# Altium footprint library Toi Library.PcbLib: 740 footprints (part 18 of 47)
Each footprint in its own frame and in the unit in brackets; x right, y up, seen from the top. Pads: shape width x height; smd on the part's side, far side on the other; paste and mask are expansions set on the pad; w line width, h text height; cw(c..) or ccw(c..) is an arc to the next point about the centre after c.
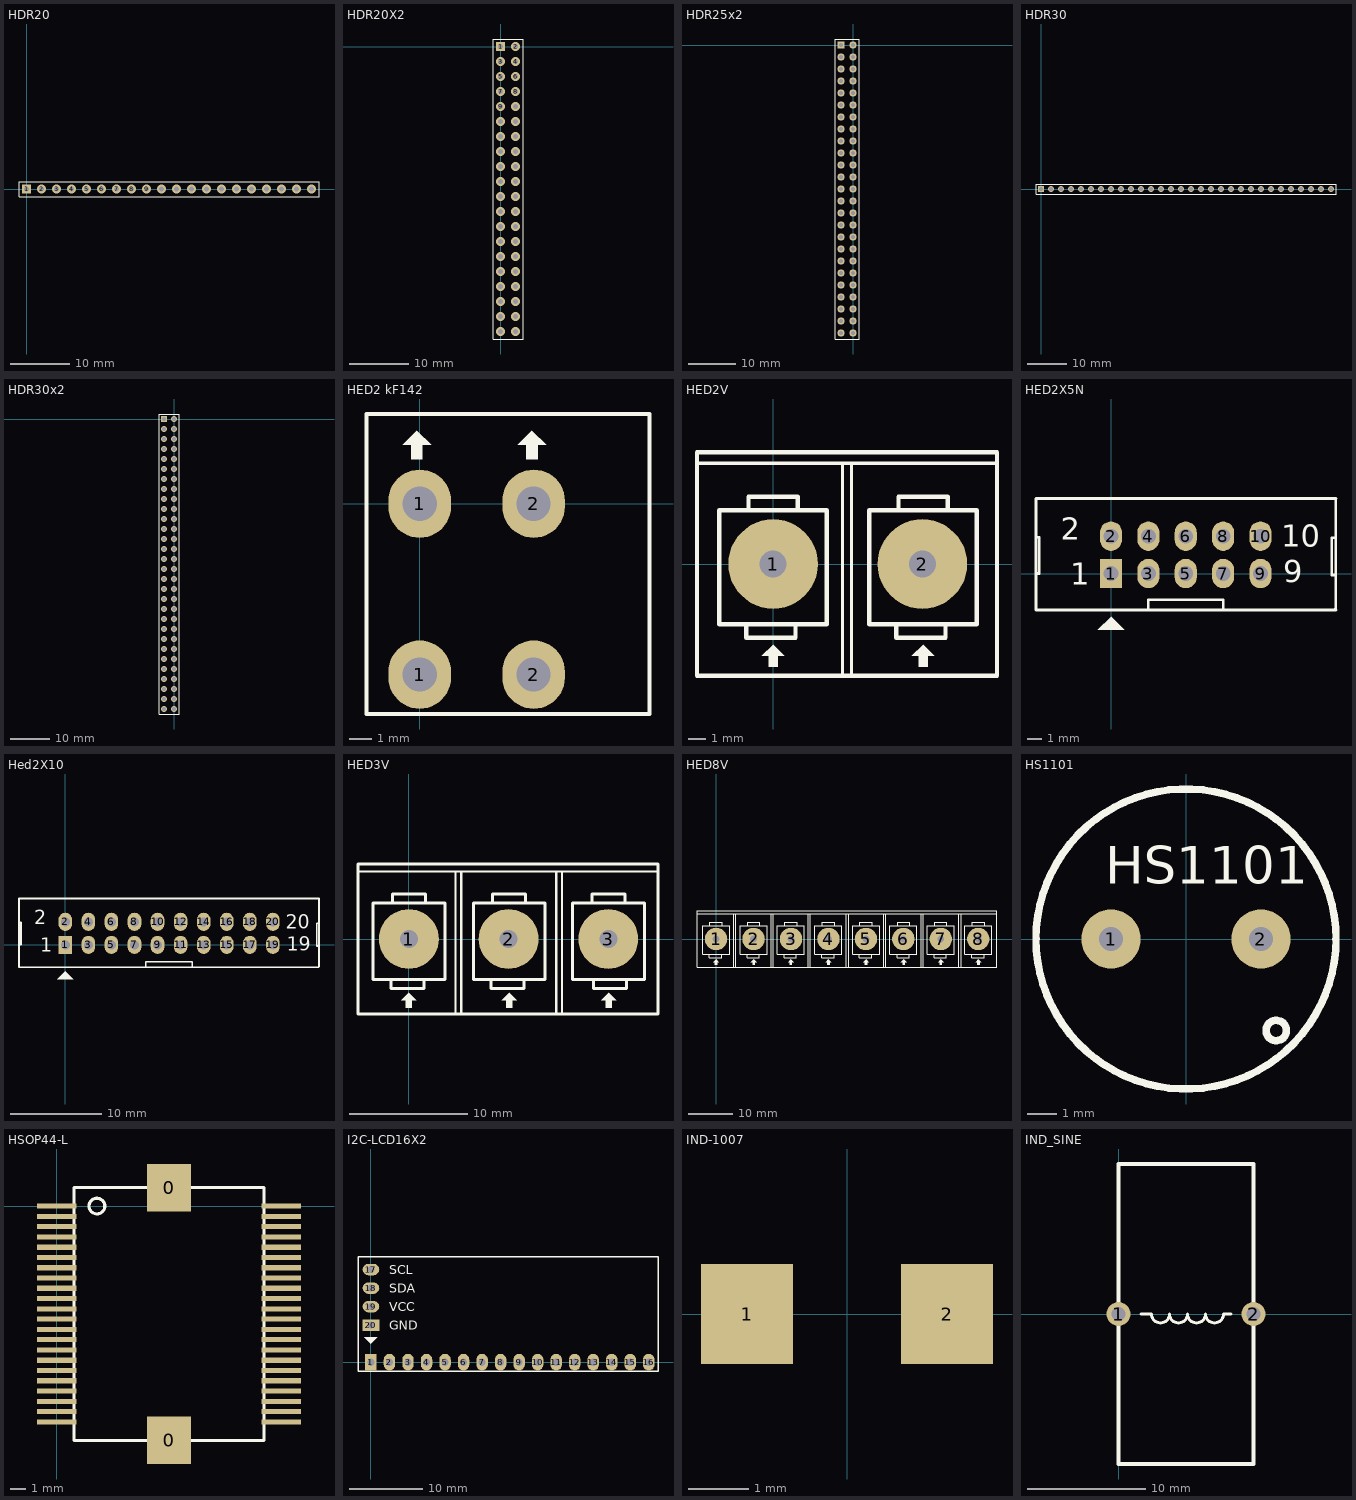
[diagram p17: the footprints below, top view; thin cyan lines are the x and y axes]

## HDR20 [mm] "Connector; Header; 20 Position"
height 1.14
pads (20):
  rect 1.5x1.5 hole 0.9: 1(0,0)
  round 1.5 hole 0.9: 2(2.54,0) 3(5.08,0) 4(7.62,0) 5(10.16,0) 6(12.7,0) 7(15.24,0) 8(17.78,0) 9(20.32,0) 10(22.86,0) 11(25.4,0) 12(27.94,0) 13(30.48,0) 14(33.02,0) 15(35.56,0) 16(38.1,0) 17(40.64,0) 18(43.18,0) 19(45.72,0) 20(48.26,0)
Top Overlay:
  lines w0.2: -1.27,-1.27 -1.27,1.27 0.635,1.27 49.53,1.27 49.53,-1.27 -1.27,-1.27
3D body "User Library-Header1x2.STEP": height 1.39, standoff -9.59, extent 44.45,-1.27 49.53,1.27
3D body "User Library-Header1x2.STEP": height 1.39, standoff -9.59, extent 39.37,-1.27 44.45,1.27
3D body "User Library-Header1x2.STEP": height 1.39, standoff -9.59, extent 34.29,-1.27 39.37,1.27
3D body "User Library-Header1x2.STEP": height 1.39, standoff -9.59, extent 29.21,-1.27 34.29,1.27
3D body "User Library-Header1x2.STEP": height 1.39, standoff -9.59, extent 24.13,-1.27 29.21,1.27
3D body "User Library-Header1x2.STEP": height 1.39, standoff -9.59, extent 19.05,-1.27 24.13,1.27
3D body "User Library-Header1x2.STEP": height 1.39, standoff -9.59, extent 13.97,-1.27 19.05,1.27
3D body "User Library-Header1x2.STEP": height 1.39, standoff -9.59, extent 8.89,-1.27 13.97,1.27
3D body "User Library-Header1x2.STEP": height 1.39, standoff -9.59, extent 3.81,-1.27 8.89,1.27
3D body "User Library-Header1x2.STEP": height 1.39, standoff -9.59, extent -1.27,-1.27 3.81,1.27

## HDR20X2 [mm] "Connector; Header; 20x2 Position"
height 1.14
pads (40):
  rect 1.5x1.5 hole 0.9: 1(0,0)
  round 1.5 hole 0.9: 2(2.54,0) 3(0,-2.54) 4(2.54,-2.54) 5(0,-5.08) 6(2.54,-5.08) 7(0,-7.62) 8(2.54,-7.62) 9(0,-10.16) 10(2.54,-10.16) 11(0,-12.7) 12(2.54,-12.7) 13(0,-15.24) 14(2.54,-15.24) 15(0,-17.78) 16(2.54,-17.78) 17(0,-20.32) 18(2.54,-20.32) 19(0,-22.86) 20(2.54,-22.86) 21(0,-25.4) 22(2.54,-25.4) 23(0,-27.94) 24(2.54,-27.94) 25(0,-30.48) 26(2.54,-30.48) 27(0,-33.02) 28(2.54,-33.02) 29(0,-35.56) 30(2.54,-35.56) 31(0,-38.1) 32(2.54,-38.1) 33(0,-40.64) 34(2.54,-40.64) 35(0,-43.18) 36(2.54,-43.18) 37(0,-45.72) 38(2.54,-45.72) 39(0,-48.26) 40(2.54,-48.26)
Top Overlay:
  lines w0.2: -1.27,-49.53 3.81,-49.53 3.81,1.27 -1.27,1.27 -1.27,-49.53
3D body "User Library-Header 2x20 2_54mm.STEP": height 8.5, standoff -2.6, extent -1.266,-49.68 3.734,1.42

## HDR25x2 [mm] "Connector; Header; 3x2 Position"
height 1.14
pads (50):
  rect 1.5x1.5 hole 0.9: 1(-2.54,0)
  round 1.5 hole 0.9: 2(0,0) 3(-2.54,-2.54) 4(0,-2.54) 5(-2.54,-5.08) 6(0,-5.08) 7(-2.54,-7.62) 8(0,-7.62) 9(-2.54,-10.16) 10(0,-10.16) 11(-2.54,-12.7) 12(0,-12.7) 13(-2.54,-15.24) 14(0,-15.24) 15(-2.54,-17.78) 16(0,-17.78) 17(-2.54,-20.32) 18(0,-20.32) 19(-2.54,-22.86) 20(0,-22.86) 21(-2.54,-25.4) 22(0,-25.4) 23(-2.54,-27.94) 24(0,-27.94) 25(-2.54,-30.48) 26(0,-30.48) 27(-2.54,-33.02) 28(0,-33.02) 29(-2.54,-35.56) 30(0,-35.56) 31(-2.54,-38.1) 32(0,-38.1) 33(-2.54,-40.64) 34(0,-40.64) 35(-2.54,-43.18) 36(0,-43.18) 37(-2.54,-45.72) 38(0,-45.72) 39(-2.54,-48.26) 40(0,-48.26) 41(-2.54,-50.8) 42(0,-50.8) 43(-2.54,-53.34) 44(0,-53.34) 45(-2.54,-55.88) 46(0,-55.88) 47(-2.54,-58.42) 48(0,-58.42) 49(-2.54,-60.96) 50(0,-60.96)
Top Overlay:
  lines w0.2: -3.81,-62.23 -3.81,1.27 1.27,1.27 1.27,-62.23 -3.81,-62.23
3D body "User Library-Header1x2.STEP": height 1.39, standoff -9.59, extent -3.81,-62.23 1.27,-59.69
3D body "User Library-Header1x2.STEP": height 1.39, standoff -9.59, extent -3.81,-59.69 1.27,-57.15
3D body "User Library-Header1x2.STEP": height 1.39, standoff -9.59, extent -3.81,-46.99 1.27,-44.45
3D body "User Library-Header1x2.STEP": height 1.39, standoff -9.59, extent -3.81,-44.45 1.27,-41.91
3D body "User Library-Header1x2.STEP": height 1.39, standoff -9.59, extent -3.81,-41.91 1.27,-39.37
3D body "User Library-Header1x2.STEP": height 1.39, standoff -9.59, extent -3.81,-49.53 1.27,-46.99
3D body "User Library-Header1x2.STEP": height 1.39, standoff -9.59, extent -3.81,-52.07 1.27,-49.53
3D body "User Library-Header1x2.STEP": height 1.39, standoff -9.59, extent -3.81,-54.61 1.27,-52.07
3D body "User Library-Header1x2.STEP": height 1.39, standoff -9.59, extent -3.81,-57.15 1.27,-54.61
3D body "User Library-Header1x2.STEP": height 1.39, standoff -9.59, extent -3.81,-39.37 1.27,-36.83
3D body "User Library-Header1x2.STEP": height 1.39, standoff -9.59, extent -3.81,-36.83 1.27,-34.29
3D body "User Library-Header1x2.STEP": height 1.39, standoff -9.59, extent -3.81,-34.29 1.27,-31.75
3D body "User Library-Header1x2.STEP": height 1.39, standoff -9.59, extent -3.81,-31.75 1.27,-29.21
3D body "User Library-Header1x2.STEP": height 1.39, standoff -9.59, extent -3.81,-21.59 1.27,-19.05
3D body "User Library-Header1x2.STEP": height 1.39, standoff -9.59, extent -3.81,-16.51 1.27,-13.97
3D body "User Library-Header1x2.STEP": height 1.39, standoff -9.59, extent -3.81,-11.43 1.27,-8.89
3D body "User Library-Header1x2.STEP": height 1.39, standoff -9.59, extent -3.81,-1.27 1.27,1.27
3D body "User Library-Header1x2.STEP": height 1.39, standoff -9.59, extent -3.81,-3.81 1.27,-1.27
3D body "User Library-Header1x2.STEP": height 1.39, standoff -9.59, extent -3.81,-6.35 1.27,-3.81
3D body "User Library-Header1x2.STEP": height 1.39, standoff -9.59, extent -3.81,-8.89 1.27,-6.35
3D body "User Library-Header1x2.STEP": height 1.39, standoff -9.59, extent -3.81,-13.97 1.27,-11.43
3D body "User Library-Header1x2.STEP": height 1.39, standoff -9.59, extent -3.81,-19.05 1.27,-16.51
3D body "User Library-Header1x2.STEP": height 1.39, standoff -9.59, extent -3.81,-24.13 1.27,-21.59
3D body "User Library-Header1x2.STEP": height 1.39, standoff -9.59, extent -3.81,-26.67 1.27,-24.13
3D body "User Library-Header1x2.STEP": height 1.39, standoff -9.59, extent -3.81,-29.21 1.27,-26.67

## HDR30 [mm] "Connector; Header; 30 Position"
pads (30):
  rect 1.5x1.5 hole 0.9: 1(0,0)
  round 1.5 hole 0.9: 2(2.54,0) 3(5.08,0) 4(7.62,0) 5(10.16,0) 6(12.7,0) 7(15.24,0) 8(17.78,0) 9(20.32,0) 10(22.86,0) 11(25.4,0) 12(27.94,0) 13(30.48,0) 14(33.02,0) 15(35.56,0) 16(38.1,0) 17(40.64,0) 18(43.18,0) 19(45.72,0) 20(48.26,0) 21(50.8,0) 22(53.34,0) 23(55.88,0) 24(58.42,0) 25(60.96,0) 26(63.5,0) 27(66.04,0) 28(68.58,0) 29(71.12,0) 30(73.66,0)
Top Overlay:
  lines w0.2: -1.27,-1.27 -1.27,1.27 0.635,1.27 74.93,1.27 74.93,-1.27 -1.27,-1.27
3D body "User Library-Header1x2.STEP": height 1.39, standoff -9.59, extent 44.45,-1.27 49.53,1.27
3D body "User Library-Header1x2.STEP": height 1.39, standoff -9.59, extent 39.37,-1.27 44.45,1.27
3D body "User Library-Header1x2.STEP": height 1.39, standoff -9.59, extent 34.29,-1.27 39.37,1.27
3D body "User Library-Header1x2.STEP": height 1.39, standoff -9.59, extent 29.21,-1.27 34.29,1.27
3D body "User Library-Header1x2.STEP": height 1.39, standoff -9.59, extent 24.13,-1.27 29.21,1.27
3D body "User Library-Header1x2.STEP": height 1.39, standoff -9.59, extent 19.05,-1.27 24.13,1.27
3D body "User Library-Header1x2.STEP": height 1.39, standoff -9.59, extent 13.97,-1.27 19.05,1.27
3D body "User Library-Header1x2.STEP": height 1.39, standoff -9.59, extent 8.89,-1.27 13.97,1.27
3D body "User Library-Header1x2.STEP": height 1.39, standoff -9.59, extent 3.81,-1.27 8.89,1.27
3D body "User Library-Header1x2.STEP": height 1.39, standoff -9.59, extent -1.27,-1.27 3.81,1.27
3D body "User Library-Header1x2.STEP": height 1.39, standoff -9.59, extent 49.53,-1.27 54.61,1.27
3D body "User Library-Header1x2.STEP": height 1.39, standoff -9.59, extent 54.61,-1.27 59.69,1.27
3D body "User Library-Header1x2.STEP": height 1.39, standoff -9.59, extent 59.69,-1.27 64.77,1.27
3D body "User Library-Header1x2.STEP": height 1.39, standoff -9.59, extent 64.77,-1.27 69.85,1.27
3D body "User Library-Header1x2.STEP": height 1.39, standoff -9.59, extent 69.85,-1.27 74.93,1.27

## HDR30x2 [mm] "Connector; Header; 3x2 Position"
height 1.14
pads (60):
  rect 1.5x1.5 hole 0.9: 1(-2.54,0)
  round 1.5 hole 0.9: 2(0,0) 3(-2.54,-2.54) 4(0,-2.54) 5(-2.54,-5.08) 6(0,-5.08) 7(-2.54,-7.62) 8(0,-7.62) 9(-2.54,-10.16) 10(0,-10.16) 11(-2.54,-12.7) 12(0,-12.7) 13(-2.54,-15.24) 14(0,-15.24) 15(-2.54,-17.78) 16(0,-17.78) 17(-2.54,-20.32) 18(0,-20.32) 19(-2.54,-22.86) 20(0,-22.86) 21(-2.54,-25.4) 22(0,-25.4) 23(-2.54,-27.94) 24(0,-27.94) 25(-2.54,-30.48) 26(0,-30.48) 27(-2.54,-33.02) 28(0,-33.02) 29(-2.54,-35.56) 30(0,-35.56) 31(-2.54,-38.1) 32(0,-38.1) 33(-2.54,-40.64) 34(0,-40.64) 35(-2.54,-43.18) 36(0,-43.18) 37(-2.54,-45.72) 38(0,-45.72) 39(-2.54,-48.26) 40(0,-48.26) 41(-2.54,-50.8) 42(0,-50.8) 43(-2.54,-53.34) 44(0,-53.34) 45(-2.54,-55.88) 46(0,-55.88) 47(-2.54,-58.42) 48(0,-58.42) 49(-2.54,-60.96) 50(0,-60.96) 51(-2.54,-63.5) 52(0,-63.5) 53(-2.54,-66.04) 54(0,-66.04) 55(-2.54,-68.58) 56(0,-68.58) 57(-2.54,-71.12) 58(0,-71.12) 59(-2.54,-73.66) 60(0,-73.66)
Top Overlay:
  lines w0.2: -3.81,-74.93 1.27,-74.93 1.27,1.27 -3.81,1.27 -3.81,-74.93
3D body "User Library-Header1x2.STEP": height 1.39, standoff -9.59, extent -3.81,-74.93 1.27,-72.39
3D body "User Library-Header1x2.STEP": height 1.39, standoff -9.59, extent -3.81,-72.39 1.27,-69.85
3D body "User Library-Header1x2.STEP": height 1.39, standoff -9.59, extent -3.81,-64.77 1.27,-62.23
3D body "User Library-Header1x2.STEP": height 1.39, standoff -9.59, extent -3.81,-67.31 1.27,-64.77
3D body "User Library-Header1x2.STEP": height 1.39, standoff -9.59, extent -3.81,-69.85 1.27,-67.31
3D body "User Library-Header1x2.STEP": height 1.39, standoff -9.59, extent -3.81,-29.21 1.27,-26.67
3D body "User Library-Header1x2.STEP": height 1.39, standoff -9.59, extent -3.81,-26.67 1.27,-24.13
3D body "User Library-Header1x2.STEP": height 1.39, standoff -9.59, extent -3.81,-24.13 1.27,-21.59
3D body "User Library-Header1x2.STEP": height 1.39, standoff -9.59, extent -3.81,-19.05 1.27,-16.51
3D body "User Library-Header1x2.STEP": height 1.39, standoff -9.59, extent -3.81,-13.97 1.27,-11.43
3D body "User Library-Header1x2.STEP": height 1.39, standoff -9.59, extent -3.81,-8.89 1.27,-6.35
3D body "User Library-Header1x2.STEP": height 1.39, standoff -9.59, extent -3.81,-6.35 1.27,-3.81
3D body "User Library-Header1x2.STEP": height 1.39, standoff -9.59, extent -3.81,-3.81 1.27,-1.27
3D body "User Library-Header1x2.STEP": height 1.39, standoff -9.59, extent -3.81,-1.27 1.27,1.27
3D body "User Library-Header1x2.STEP": height 1.39, standoff -9.59, extent -3.81,-11.43 1.27,-8.89
3D body "User Library-Header1x2.STEP": height 1.39, standoff -9.59, extent -3.81,-16.51 1.27,-13.97
3D body "User Library-Header1x2.STEP": height 1.39, standoff -9.59, extent -3.81,-21.59 1.27,-19.05
3D body "User Library-Header1x2.STEP": height 1.39, standoff -9.59, extent -3.81,-31.75 1.27,-29.21
3D body "User Library-Header1x2.STEP": height 1.39, standoff -9.59, extent -3.81,-34.29 1.27,-31.75
3D body "User Library-Header1x2.STEP": height 1.39, standoff -9.59, extent -3.81,-36.83 1.27,-34.29
3D body "User Library-Header1x2.STEP": height 1.39, standoff -9.59, extent -3.81,-39.37 1.27,-36.83
3D body "User Library-Header1x2.STEP": height 1.39, standoff -9.59, extent -3.81,-57.15 1.27,-54.61
3D body "User Library-Header1x2.STEP": height 1.39, standoff -9.59, extent -3.81,-54.61 1.27,-52.07
3D body "User Library-Header1x2.STEP": height 1.39, standoff -9.59, extent -3.81,-52.07 1.27,-49.53
3D body "User Library-Header1x2.STEP": height 1.39, standoff -9.59, extent -3.81,-49.53 1.27,-46.99
3D body "User Library-Header1x2.STEP": height 1.39, standoff -9.59, extent -3.81,-41.91 1.27,-39.37
3D body "User Library-Header1x2.STEP": height 1.39, standoff -9.59, extent -3.81,-44.45 1.27,-41.91
3D body "User Library-Header1x2.STEP": height 1.39, standoff -9.59, extent -3.81,-46.99 1.27,-44.45
3D body "User Library-Header1x2.STEP": height 1.39, standoff -9.59, extent -3.81,-59.69 1.27,-57.15
3D body "User Library-Header1x2.STEP": height 1.39, standoff -9.59, extent -3.81,-62.23 1.27,-59.69

## HED2 kF142 [mil] "Header 2, 2 pin, hight 300mil, Pin to Pin 200, Colour Green"
height 300
pads (4):
  oval 110x120 hole 60: 1(0,-300) 1(0,0) 2(200,-300) 2(200,0)
Top Overlay:
  region: 197.01,128.35 172.01,103.35 187.01,103.35 187.01,78.35 207.01,78.35 207.01,103.35 222.01,103.35
  region: -5.08,128.35 -30.08,103.35 -15.08,103.35 -15.08,78.35 4.92,78.35 4.92,103.35 19.92,103.35
  lines w7: -93.5,-369.09 -93.5,157.48 403.54,157.48 403.54,-39.33 403.54,-118.54 403.54,-369.09 -93.5,-369.09
3D body "20020302h021b01lf.stp": height 566.93, standoff -147.64, extent -89.96,-367.13 408.46,152.53

## HED2V [mil] "Header 6"
height 300
pads (2):
  round 200 hole 60: 1(0,0) 2(333.33,0)
Top Overlay:
  region: 0,-180 -25,-205 -10,-205 -10,-230 10,-230 10,-205 25,-205
  region: 335,-180 310,-205 325,-205 325,-230 345,-230 345,-205 360,-205
  lines w7: -170,225 499,225 ; 155,-250 155,225 ; 175,-250 175,225
  lines w10: -60,-135 -60,-165 50,-165 50,-135 ; -55,120 -55,150 55,150 55,120 ; 275,-135 275,-165 385,-165 385,-135 ; 280,120 280,150 390,150 390,120 ; -170,-250 500,-250 500,250 -170,250 -170,-250 ; -120,-135 -120,120 120,120 120,-135 -120,-135 ; 215,-135 455,-135 455,120 215,120 215,-135

## HED2X5N [mm] "Connector; Header; 5x2 Position"
pads (10):
  rect 1.5x2 hole 1: 1(0,0)
  oval 1.5x2 hole 1: 2(0,2.54) 3(2.54,0) 4(2.54,2.54) 5(5.08,0) 6(5.08,2.54) 7(7.62,0) 8(7.62,2.54) 9(10.16,0) 10(10.16,2.54)
Top Overlay:
  region: 0,-2.921 -0.889,-3.81 0.889,-3.81
  lines w0.178: -5.1,-0.025 -5.075,0 -4.875,0 -4.875,2.475 -5.1,2.475 ; 2.525,-2.438 2.525,-1.778 7.625,-1.778 7.625,-2.464 ; 15.203,-2.45 15.265,-2.388 ; 15.265,-0.102 15.011,-0.102 15.011,2.423 15.265,2.423 ; 15.291,-2.475 -5.1,-2.475 -5.1,5.1 ; -5.1,5.1 15.291,5.1 -5.1,5.1 ; 15.265,-2.388 15.265,5.105 15.265,-2.388
  text "1" at -2.775,-0.75 h1.52
  text "2" at -3.429,2.286 h1.52
  text "9" at 11.709,-0.61 h1.52
  text "10" at 11.582,1.803 h1.52
3D body "User Library-HDB-10.step": height 8.8, standoff -3, extent -5.071,-3.708 15.129,5.692

## Hed2X10 [mm] "Header 10x2,20 pin, connecter"
height 7.62
pads (20):
  rect 1.5x2 hole 1: 1(0,0)
  oval 1.5x2 hole 1: 2(0,2.54) 3(2.54,0) 4(2.54,2.54) 5(5.08,0) 6(5.08,2.54) 7(7.62,0) 8(7.62,2.54) 9(10.16,0) 10(10.16,2.54) 11(12.7,0) 12(12.7,2.54) 13(15.24,0) 14(15.24,2.54) 15(17.78,0) 16(17.78,2.54) 17(20.32,0) 18(20.32,2.54) 19(22.86,0) 20(22.86,2.54)
Top Overlay:
  region: 0,-2.921 -0.889,-3.81 0.889,-3.81
  lines w0.178: -5.1,-0.025 -5.075,0 -4.875,0 -4.875,2.475 -5.1,2.475 ; 8.875,-2.475 8.875,-1.875 13.975,-1.875 13.975,-2.425 14.025,-2.475 ; 27.94,-0.127 27.686,-0.127 27.686,2.398 27.94,2.398 ; 27.94,5.08 27.94,-2.413 27.878,-2.475 -5.1,-2.475 -5.1,5.1 27.94,5.1
  text "20" at 24.257,1.778 h1.52
  text "19" at 24.384,-0.635 h1.52
  text "2" at -3.429,2.286 h1.52
  text "1" at -2.775,-0.75 h1.52
3D body "20 vuong.step": height 9.1, standoff -3, extent -5.17,-3.28 28.03,6.02

## HED3V [mil] "Header 3 - 20A"
height 300
pads (3):
  round 200 hole 60: 1(0,0) 2(333,0) 3(666,0)
Top Overlay:
  region: 667,-180 692,-205 677,-205 677,-230 657,-230 657,-205 642,-205
  region: 335,-180 310,-205 325,-205 325,-230 345,-230 345,-205 360,-205
  region: 0,-180 -25,-205 -10,-205 -10,-230 10,-230 10,-205 25,-205
  lines w7: -170,225 829,225 ; 155,-250 155,225 ; 175,-250 175,225 ; 492,-250 492,225 ; 512,-250 512,225
  lines w10: -60,-135 -60,-165 50,-165 50,-135 ; -55,120 -55,150 55,150 55,120 ; 275,-135 275,-165 385,-165 385,-135 ; 280,120 280,150 390,150 390,120 ; 612,120 612,150 722,150 722,120 ; 617,-135 617,-165 727,-165 727,-135 ; 831,250 -170,250 -170,-250 832,-250 832,250 ; -120,-135 120,-135 120,120 -120,120 -120,-135 ; 215,-135 215,120 455,120 455,-135 215,-135 ; 547,-135 787,-135 787,120 547,120 547,-135

## HED8V [mil] "Header 6"
height 300
pads (8):
  round 200 hole 60: 1(0,0) 2(333.33,0) 3(666.67,0) 4(1000,0) 5(1333.33,0) 6(1666.67,0) 7(2000,0) 8(2333.33,0)
Top Overlay:
  drawing of 107 lines, arcs and shapes, not listed

## HS1101 [mm] "Relative Humidity Sensor - pin to pin 200mil"
pads (2):
  round 2 hole 0.8: 1(-2.54,0) 2(2.54,0)
Top Overlay:
  circle w0.254: c3.058,-3.099 r0.345
  circle w0.254: c0,0 r5.08
  text "HS1101" at -2.743,1.88 h1.27

## HSOP44-L [mm]
pads (46):
  rect 2.8x3 smd: 0(7.1,-14.815) 0(7.1,1.162)
  rect 2.5x0.325 smd: 1(0,0) 2(0,-0.65) 3(0,-1.3) 4(0,-1.95) 5(0,-2.6) 6(0,-3.25) 7(0,-3.9) 8(0,-4.55) 9(0,-5.2) 10(0,-5.85) 11(0,-6.5) 12(0,-7.15) 13(0,-7.8) 14(0,-8.45) 15(0,-9.1) 16(0,-9.75) 17(0,-10.4) 18(0,-11.05) 19(0,-11.7) 20(0,-12.35) 21(0,-13) 22(0,-13.65) 23(14.2,-13.65) 24(14.2,-13) 25(14.2,-12.35) 26(14.2,-11.7) 27(14.2,-11.05) 28(14.2,-10.4) 29(14.2,-9.75) 30(14.2,-9.1) 31(14.2,-8.45) 32(14.2,-7.8) 33(14.2,-7.15) 34(14.2,-6.5) 35(14.2,-5.85) 36(14.2,-5.2) 37(14.2,-4.55) 38(14.2,-3.9) 39(14.2,-3.25) 40(14.2,-2.6) 41(14.2,-1.95) 42(14.2,-1.3) 43(14.2,-0.65) 44(14.2,0)
Top Overlay:
  circle w0.2: c2.54,0 r0.5
  lines w0.2: 1.1,-14.825 13.1,-14.825 13.1,1.175 1.1,1.175 1.1,-14.825

## I2C-LCD16X2 [mil] "LCD dipslay 16x2, 16 pin"
height 400
pads (20):
  rect 62x90 hole 39: 1(0,0)
  oval 62x90 hole 39: 2(100,0) 3(200,0) 4(300,0) 5(400,0) 6(500,0) 7(600,0) 8(700,0) 9(800,0) 10(900,0) 11(1000,0) 12(1100,0) 13(1200,0) 14(1300,0) 15(1400,0) 16(1500,0)
  oval 90x62 hole 39: 17(0,500) 18(0,400) 19(0,300)
  rect 90x62 hole 39: 20(0,200)
Top Overlay:
  region: 0,100 35,135 -35,135
  lines w7: -70,-50 -70,570 1550,570 1550,-50 -70,-50
  text "SCL" at 100,475 h50
  text "SDA" at 100,375 h50
  text "VCC" at 100,275 h50
  text "GND" at 100,175 h50

## IND-1007 [mil]
pads (2):
  rect 60x65 smd: 1(-65,0) 2(65,0)
3D body "User Library-IND_1007.STEP": height 71.46, standoff 0.6, extent -49.21,-35.44 49.21,35.43

## IND_SINE [mil]
pads (2):
  round 80 hole 47.24: 1(0,0) 2(450,0)
Top Overlay:
  lines w10: 75,0 110,0 ccw(c140,0) 170,0 ccw(c200,0) 230,0 ccw(c260,0) 290,0 ccw(c320,0) 350,0 375,0
  lines w12: 0,-500 450,-500 450,500 0,500 0,0 0,-500